# Altium footprint library GyokuRe.PcbLib: 1248 footprints (part 65 of 78)
Each footprint in its own frame and in the unit in brackets; x right, y up, seen from the top. Pads: shape width x height; smd on the part's side, far side on the other; paste and mask are expansions set on the pad; w line width, h text height; cw(c..) or ccw(c..) is an arc to the next point about the centre after c.
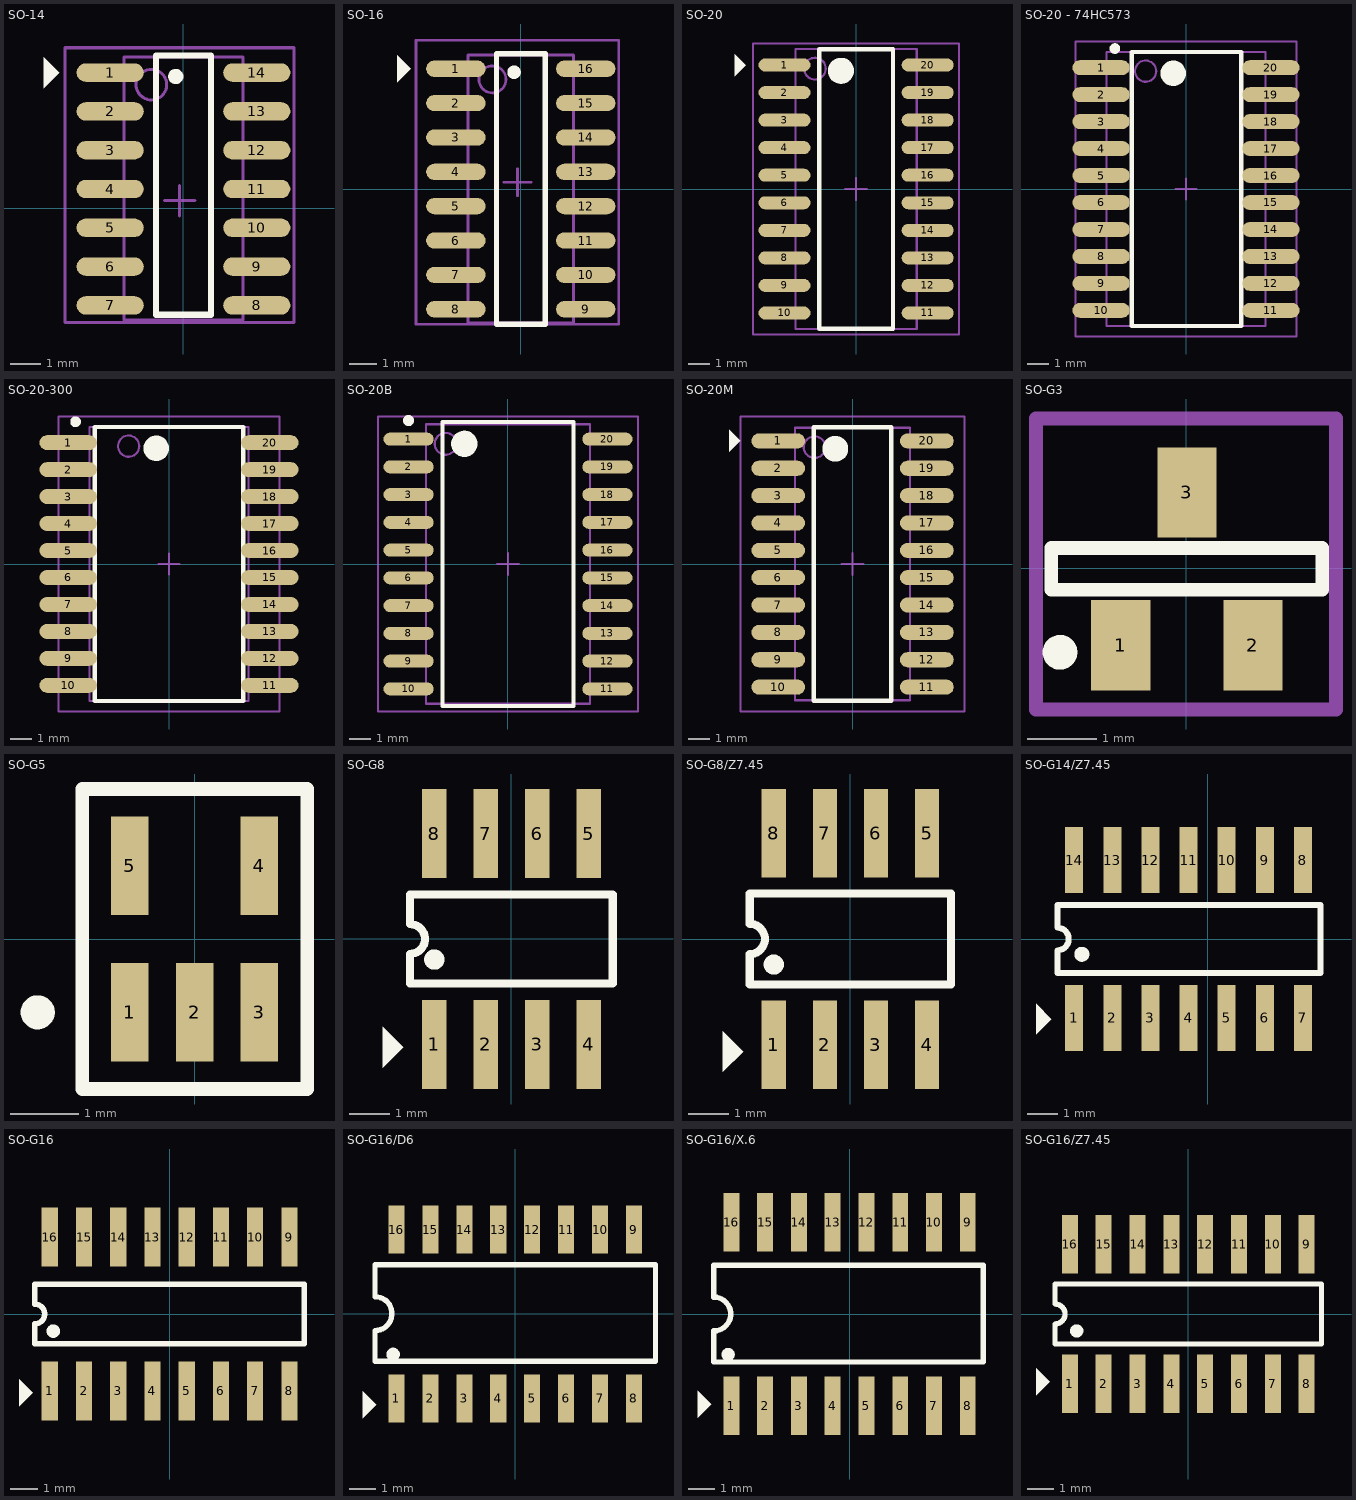
[diagram p64: the footprints below, top view; thin cyan lines are the x and y axes]

## SO-14 [mm] "SOIC, 14-Leads, Body 9.9x3.9mm, Pitch 1.27mm, IPC Medium Density"
height 1.75
pads (14):
  oval 2.2x0.6 smd: 1(-2.4,4.445) 2(-2.4,3.175) 3(-2.4,1.905) 4(-2.4,0.635) 5(-2.4,-0.635) 6(-2.4,-1.905) 7(-2.4,-3.175) 8(2.4,-3.175) 9(2.4,-1.905) 10(2.4,-0.635) 11(2.4,0.635) 12(2.4,1.905) 13(2.4,3.175) 14(2.4,4.445)
Top Overlay:
  circle w0.25: c-0.252,4.318 r0.125
  region: -4.572,3.937 -4.064,4.445 -4.572,4.953
  lines w0.2: -0.9,-3.48 0.9,-3.48 0.9,5 -0.9,5 -0.9,-3.48
Mechanical 13:
  circle w0.1: c-1.05,4.05 r0.5
  lines w0.1: -1.95,-3.658 1.95,-3.658 1.95,4.95 -1.95,4.95 -1.95,-3.658
Mechanical 15:
  lines w0.1: -0.627,0.254 0.373,0.254 ; -0.127,-0.246 -0.127,0.754 ; -3.877,-3.734 3.623,-3.734 3.623,5.258 -3.877,5.258 -3.877,-3.734
3D body "User Library-SOP14-p127-780.STEP": height 1.1, standoff 0, extent -3.708,-4.474 3.592,5.726

## SO-16 [mm] "SOIC, 16-Leads, Body 9.9x3.9mm, Pitch 1.27mm, IPC Medium Density"
height 1.75
pads (16):
  oval 2.2x0.6 smd: 1(-2.4,4.445) 2(-2.4,3.175) 3(-2.4,1.905) 4(-2.4,0.635) 5(-2.4,-0.635) 6(-2.4,-1.905) 7(-2.4,-3.175) 8(-2.4,-4.445) 9(2.4,-4.445) 10(2.4,-3.175) 11(2.4,-1.905) 12(2.4,-0.635) 13(2.4,0.635) 14(2.4,1.905) 15(2.4,3.175) 16(2.4,4.445)
Top Overlay:
  circle w0.25: c-0.252,4.318 r0.125
  region: -4.572,3.937 -4.064,4.445 -4.572,4.953
  lines w0.2: -0.9,-5 -0.9,5 0.9,5 0.9,-5 -0.9,-5
Mechanical 13:
  circle w0.1: c-1.05,4.05 r0.5
  lines w0.1: -1.95,-4.95 -1.95,4.95 1.95,4.95 1.95,-4.95 -1.95,-4.95
Mechanical 15:
  lines w0.1: -0.627,0.254 0.373,0.254 ; -0.127,-0.246 -0.127,0.754 ; -3.877,-4.996 -3.877,5.504 3.623,5.504 3.623,-4.996 -3.877,-4.996

## SO-20 [mm] "20-Pin Small Outline Package 1.27 mm Pitch"
height 2
pads (20):
  oval 2.4x0.6 smd: 1(-3.3,5.715) 2(-3.3,4.445) 3(-3.3,3.175) 4(-3.3,1.905) 5(-3.3,0.635) 6(-3.3,-0.635) 7(-3.3,-1.905) 8(-3.3,-3.175) 9(-3.3,-4.445) 10(-3.3,-5.715) 11(3.3,-5.715) 12(3.3,-4.445) 13(3.3,-3.175) 14(3.3,-1.905) 15(3.3,-0.635) 16(3.3,0.635) 17(3.3,1.905) 18(3.3,3.175) 19(3.3,4.445) 20(3.3,5.715)
Top Overlay:
  circle w0.6: c-0.7,5.45 r0.3
  region: -5.588,5.207 -5.08,5.715 -5.588,6.223
  lines w0.2: -1.7,-6.45 1.7,-6.45 1.7,6.45 -1.7,6.45 -1.7,-6.45
Mechanical 13:
  circle w0.1: c-1.9,5.55 r0.5
  lines w0.1: -2.8,-6.45 2.8,-6.45 2.8,6.45 -2.8,6.45 -2.8,-6.45
Mechanical 15:
  lines w0.1: -0.5,0 0.5,0 ; 0,-0.5 0,0.5 ; -4.75,-6.7 4.75,-6.7 4.75,6.7 -4.75,6.7 -4.75,-6.7
3D body "User Library-SOP20.STEP": height 1.95, standoff -0.05, extent -4.024,-6.325 4.076,6.375

## SO-20 - 74HC573 [mm] ": plastic small outline package; 20 leads; body width 7.5 mm"
height 2
pads (20):
  oval 2.7x0.7 smd: 1(-4,5.715) 2(-4,4.445) 3(-4,3.175) 4(-4,1.905) 5(-4,0.635) 6(-4,-0.635) 7(-4,-1.905) 8(-4,-3.175) 9(-4,-4.445) 10(-4,-5.715) 11(4,-5.715) 12(4,-4.445) 13(4,-3.175) 14(4,-1.905) 15(4,-0.635) 16(4,0.635) 17(4,1.905) 18(4,3.175) 19(4,4.445) 20(4,5.715)
Top Overlay:
  circle w0.6: c-0.6,5.45 r0.3
  circle w0.25: c-3.35,6.615 r0.125
  lines w0.2: -2.55,-6.45 2.6,-6.45 2.6,6.45 -2.55,6.45 -2.55,-6.45
Mechanical 2:
  text "74HC573" at 0.375,5.225 h1.52
Mechanical 13:
  circle w0.1: c-1.9,5.55 r0.5
  lines w0.1: -3.75,-6.45 3.75,-6.45 3.75,6.45 -3.75,6.45 -3.75,-6.45
Mechanical 15:
  lines w0.1: -0.5,0 0.5,0 ; 0,-0.5 0,0.5 ; -5.2,-6.95 5.2,-6.95 5.2,6.95 -5.2,6.95 -5.2,-6.95
3D body: height 0.25, standoff 0, extent 3.75,5.475 5.25,5.975
3D body: height 0.25, standoff 0, extent -5.25,5.5 -3.75,6
3D body: height 0.25, standoff 0, extent -5.25,4.2 -3.75,4.7
3D body: height 0.25, standoff 0, extent 3.75,4.175 5.25,4.675
3D body: height 0.25, standoff 0, extent -5.25,2.925 -3.75,3.425
3D body: height 0.25, standoff 0, extent 3.75,2.9 5.25,3.4
3D body: height 0.25, standoff 0, extent -5.25,1.65 -3.75,2.15
3D body: height 0.25, standoff 0, extent 3.75,1.625 5.25,2.125
3D body: height 0.25, standoff 0, extent -5.25,0.375 -3.75,0.875
3D body: height 0.25, standoff 0, extent 3.75,0.35 5.25,0.85
3D body: height 0.25, standoff 0, extent -5.25,-0.875 -3.75,-0.375
3D body: height 0.25, standoff 0, extent 3.75,-0.9 5.25,-0.4
3D body: height 0.25, standoff 0, extent -5.25,-2.15 -3.75,-1.65
3D body: height 0.25, standoff 0, extent 3.75,-2.175 5.25,-1.675
3D body: height 0.25, standoff 0, extent -5.25,-3.425 -3.75,-2.925
3D body: height 0.25, standoff 0, extent 3.75,-3.45 5.25,-2.95
3D body: height 0.25, standoff 0, extent -5.25,-4.7 -3.75,-4.2
3D body: height 0.25, standoff 0, extent 3.75,-4.725 5.25,-4.225
3D body: height 0.25, standoff 0, extent -5.25,-5.95 -3.75,-5.45
3D body: height 0.25, standoff 0, extent 3.75,-5.975 5.25,-5.475
3D body: height 2, standoff 0, extent -3.75,-6.45 3.75,6.45

## SO-20-300 [mm] ": plastic small outline package; 20 leads; body width 7.5 mm"
height 2
pads (20):
  oval 2.7x0.7 smd: 1(-4.75,5.715) 2(-4.75,4.445) 3(-4.75,3.175) 4(-4.75,1.905) 5(-4.75,0.635) 6(-4.75,-0.635) 7(-4.75,-1.905) 8(-4.75,-3.175) 9(-4.75,-4.445) 10(-4.75,-5.715) 11(4.75,-5.715) 12(4.75,-4.445) 13(4.75,-3.175) 14(4.75,-1.905) 15(4.75,-0.635) 16(4.75,0.635) 17(4.75,1.905) 18(4.75,3.175) 19(4.75,4.445) 20(4.75,5.715)
Top Overlay:
  circle w0.6: c-0.6,5.45 r0.3
  circle w0.25: c-4.4,6.7 r0.125
  lines w0.2: -3.5,-6.45 3.5,-6.45 3.5,6.45 -3.5,6.45 -3.5,-6.45
Mechanical 13:
  circle w0.1: c-1.9,5.55 r0.5
  lines w0.1: -3.75,-6.45 3.75,-6.45 3.75,6.45 -3.75,6.45 -3.75,-6.45
Mechanical 15:
  lines w0.1: -0.5,0 0.5,0 ; 0,-0.5 0,0.5 ; -5.2,-6.95 5.2,-6.95 5.2,6.95 -5.2,6.95 -5.2,-6.95
3D body "SOIC20-300.STEP": height 2.65, standoff 0, extent -5.175,-6.4 5.125,6.4

## SO-20B [mm] "SOIC, 20-Leads, Body 12.8x7.5mm, Pitch 1.27mm, IPC Medium Density"
height 2.6
pads (20):
  oval 2.3x0.6 smd: 1(-4.55,5.715) 2(-4.55,4.445) 3(-4.55,3.175) 4(-4.55,1.905) 5(-4.55,0.635) 6(-4.55,-0.635) 7(-4.55,-1.905) 8(-4.55,-3.175) 9(-4.55,-4.445) 10(-4.55,-5.715) 11(4.55,-5.715) 12(4.55,-4.445) 13(4.55,-3.175) 14(4.55,-1.905) 15(4.55,-0.635) 16(4.55,0.635) 17(4.55,1.905) 18(4.55,3.175) 19(4.55,4.445) 20(4.55,5.715)
Top Overlay:
  circle w0.25: c-4.55,6.565 r0.125
  circle w0.6: c-2,5.5 r0.3
  lines w0.2: -3,-6.5 -3,6.5 3,6.5 3,-6.5 -3,-6.5
Mechanical 13:
  circle w0.1: c-2.85,5.5 r0.5
  lines w0.1: -3.75,-6.4 -3.75,6.4 3.75,6.4 3.75,-6.4 -3.75,-6.4
Mechanical 15:
  lines w0.1: -0.5,0 0.5,0 ; 0,-0.5 0,0.5 ; -5.95,-6.75 -5.95,6.75 5.95,6.75 5.95,-6.75 -5.95,-6.75
3D body "User Library-SOP20.STEP": height 1.95, standoff -0.05, extent -4.101,-6.325 3.999,6.375

## SO-20M [mm] "SOP, 20-Leads, Body 12.6x5.3mm, Pitch 1.27mm, IPC Low Density"
height 1.96
pads (20):
  oval 2.5x0.7 smd: 1(-3.45,5.715) 2(-3.45,4.445) 3(-3.45,3.175) 4(-3.45,1.905) 5(-3.45,0.635) 6(-3.45,-0.635) 7(-3.45,-1.905) 8(-3.45,-3.175) 9(-3.45,-4.445) 10(-3.45,-5.715) 11(3.45,-5.715) 12(3.45,-4.445) 13(3.45,-3.175) 14(3.45,-1.905) 15(3.45,-0.635) 16(3.45,0.635) 17(3.45,1.905) 18(3.45,3.175) 19(3.45,4.445) 20(3.45,5.715)
Top Overlay:
  circle w0.6: c-0.8,5.35 r0.3
  region: -5.715,5.207 -5.207,5.715 -5.715,6.223
  lines w0.2: -1.8,-6.35 1.8,-6.35 1.8,6.35 -1.8,6.35 -1.8,-6.35
Mechanical 13:
  circle w0.1: c-1.765,5.425 r0.5
  lines w0.1: -2.665,-6.325 2.665,-6.325 2.665,6.325 -2.665,6.325 -2.665,-6.325
Mechanical 15:
  lines w0.1: -0.5,0 0.5,0 ; 0,-0.5 0,0.5 ; -5.2,-6.85 5.2,-6.85 5.2,6.85 -5.2,6.85 -5.2,-6.85
3D body: height 1.96, standoff 0, extent -2.665,-6.325 2.665,6.325

## SO-G3 [mm]
pads (3):
  rect 0.85x1.3 smd: 1(-0.939,-1.107) 2(0.961,-1.107) 3(0.011,1.093)
Top Overlay:
  circle w0.25: c-1.814,-1.207 r0.125
  lines w0.2: -1.939,-0.307 1.961,-0.307 1.961,0.293 -1.939,0.293 -1.939,-0.307
Mechanical 13:
  lines w0.2: -2.159,-2.032 -2.159,2.159 2.159,2.159 2.159,-2.032 -2.159,-2.032
3D body: height 2.54, standoff 0, extent -1.651,-0.635 1.651,0.635
3D body: height 0.51, standoff 0, extent -1.27,-1.524 -0.635,-0.635
3D body: height 0.51, standoff 0, extent 0.63,-1.524 1.265,-0.635
3D body: height 0.51, standoff 0, extent -0.293,0.621 0.342,1.51

## SO-G5 [mm] "Small Outline; 5 Leads; Body Width 5.2 mm; Pitch 1.27 mm"
pads (5):
  rect 0.55x1.45 smd: 1(-0.954,-1.07) 2(-0.004,-1.07) 3(0.946,-1.07) 4(0.946,1.08) 5(-0.954,1.08)
Top Overlay:
  circle w0.25: c-2.304,-1.07 r0.125
  lines w0.2: -1.654,-2.195 1.646,-2.195 1.646,2.205 -1.654,2.205 -1.654,-2.195
Mechanical 13:
  text ".Designator" at 0.483,-1.93 h2.03
3D body: height 0.89, standoff 0, extent -1.27,-1.778 1.27,1.778

## SO-G8 [mm] "Small Outline; 8 Leads; Body Width 3.9 mm; Pitch 1.27 mm"
height 1.75
pads (8):
  rect 0.6x2.2 smd: 1(-1.905,-2.6) 2(-0.635,-2.6) 3(0.635,-2.6) 4(1.905,-2.6) 5(1.905,2.6) 6(0.635,2.6) 7(-0.635,2.6) 8(-1.905,2.6)
Top Overlay:
  circle w0.25: c-1.903,-0.508 r0.125
  region: -3.175,-3.175 -2.667,-2.667 -3.175,-2.159
  lines w0.2: -2.5,-1.1 2.5,-1.1 2.5,1.1 -2.5,1.1 -2.5,0.367 cw(c-2.5,0) -2.5,-0.367 -2.5,-1.1

## SO-G8/Z7.45 [mm] "Small Outline; 8 Leads; Body Width 3.9 mm; Pitch 1.27 mm"
height 1.75
pads (8):
  rect 0.6x2.2 smd: 1(-1.905,-2.625) 2(-0.635,-2.625) 3(0.635,-2.625) 4(1.905,-2.625) 5(1.905,2.625) 6(0.635,2.625) 7(-0.635,2.625) 8(-1.905,2.625)
Top Overlay:
  circle w0.25: c-1.903,-0.635 r0.125
  region: -3.175,-3.302 -2.667,-2.794 -3.175,-2.286
  lines w0.2: -2.5,-1.125 -2.5,-0.375 ccw(c-2.5,0) -2.5,0.375 -2.5,1.125 2.5,1.125 2.5,-1.125 -2.5,-1.125

## SO-G14/Z7.45 [mm] "Small Outline; 14 Leads; Body Width 3.9 mm; Pitch 1.27 mm"
height 1.75
pads (14):
  rect 0.6x2.2 smd: 1(-4.445,-2.625) 2(-3.175,-2.625) 3(-1.905,-2.625) 4(-0.635,-2.625) 5(0.635,-2.625) 6(1.905,-2.625) 7(3.175,-2.625) 8(3.175,2.625) 9(1.905,2.625) 10(0.635,2.625) 11(-0.635,2.625) 12(-1.905,2.625) 13(-3.175,2.625) 14(-4.445,2.625)
Top Overlay:
  circle w0.25: c-4.189,-0.508 r0.125
  region: -5.715,-3.175 -5.207,-2.667 -5.715,-2.159
  lines w0.2: -5,-1.125 3.759,-1.125 3.759,1.125 -5,1.125 -5,0.375 cw(c-5,0) -5,-0.375 -5,-1.125

## SO-G16 [mm] "Small Outline; 16 Leads; Body Width 3.9 mm; Pitch 1.27 mm"
height 1.75
pads (16):
  rect 0.6x2.2 smd: 1(-4.445,-2.854) 2(-3.175,-2.854) 3(-1.905,-2.854) 4(-0.635,-2.854) 5(0.635,-2.854) 6(1.905,-2.854) 7(3.175,-2.854) 8(4.445,-2.854) 9(4.445,2.854) 10(3.175,2.854) 11(1.905,2.854) 12(0.635,2.854) 13(-0.635,2.854) 14(-1.905,2.854) 15(-3.175,2.854) 16(-4.445,2.854)
Top Overlay:
  circle w0.25: c-4.316,-0.635 r0.125
  region: -5.588,-3.429 -5.08,-2.921 -5.588,-2.413
  lines w0.2: -5,-1.1 5,-1.1 5,1.1 -5,1.1 -5,0.367 cw(c-5,0) -5,-0.367 -5,-1.1

## SO-G16/D6 [mm] "Small Outline; 16 Leads; Body Width 5.3 mm; Pitch 1.27 mm"
height 2
pads (16):
  rect 0.6x1.8 smd: 1(-4.445,-3.168) 2(-3.175,-3.168) 3(-1.905,-3.168) 4(-0.635,-3.168) 5(0.635,-3.168) 6(1.905,-3.168) 7(3.175,-3.168) 8(4.445,-3.168) 9(4.445,3.143) 10(3.175,3.143) 11(1.905,3.143) 12(0.635,3.143) 13(-0.635,3.143) 14(-1.905,3.143) 15(-3.175,3.143) 16(-4.445,3.143)
Top Overlay:
  circle w0.25: c-4.57,-1.524 r0.125
  region: -5.715,-3.912 -5.207,-3.404 -5.715,-2.896
  lines w0.2: -5.25,-1.778 -5.25,-0.635 ccw(c-5.25,0) -5.25,0.635 -5.25,1.829 5.25,1.829 5.25,-1.778 -5.25,-1.778

## SO-G16/X.6 [mm] "Small Outline; 16 Leads; Body Width 5.3 mm; Pitch 1.27 mm"
height 2
pads (16):
  rect 0.6x2.2 smd: 1(-4.445,-3.448) 2(-3.175,-3.448) 3(-1.905,-3.448) 4(-0.635,-3.448) 5(0.635,-3.448) 6(1.905,-3.448) 7(3.175,-3.448) 8(4.445,-3.448) 9(4.445,3.448) 10(3.175,3.448) 11(1.905,3.448) 12(0.635,3.448) 13(-0.635,3.448) 14(-1.905,3.448) 15(-3.175,3.448) 16(-4.445,3.448)
Top Overlay:
  circle w0.25: c-4.57,-1.524 r0.125
  region: -5.715,-3.912 -5.207,-3.404 -5.715,-2.896
  lines w0.2: -5.105,0.635 cw(c-5.105,0) -5.105,-0.635 -5.105,-1.803 5.029,-1.803 5.029,1.829 -5.105,1.829 -5.105,0.686

## SO-G16/Z7.45 [mm] "Small Outline; 16 Leads; Body Width 3.9 mm; Pitch 1.27 mm"
height 1.75
pads (16):
  rect 0.6x2.2 smd: 1(-4.445,-2.625) 2(-3.175,-2.625) 3(-1.905,-2.625) 4(-0.635,-2.625) 5(0.635,-2.625) 6(1.905,-2.625) 7(3.175,-2.625) 8(4.445,-2.625) 9(4.445,2.625) 10(3.175,2.625) 11(1.905,2.625) 12(0.635,2.625) 13(-0.635,2.625) 14(-1.905,2.625) 15(-3.175,2.625) 16(-4.445,2.625)
Top Overlay:
  circle w0.25: c-4.189,-0.635 r0.125
  region: -5.715,-3.048 -5.207,-2.54 -5.715,-2.032
  lines w0.2: -5,-1.125 5,-1.125 5,1.125 -5,1.125 -5,0.375 cw(c-5,0) -5,-0.375 -5,-1.125